# Altium footprint library CeleronLib_THD.PcbLib: 217 footprints (part 2 of 14)
Each footprint in its own frame and in the unit in brackets; x right, y up, seen from the top. Pads: shape width x height; smd on the part's side, far side on the other; paste and mask are expansions set on the pad; w line width, h text height; cw(c..) or ccw(c..) is an arc to the next point about the centre after c.
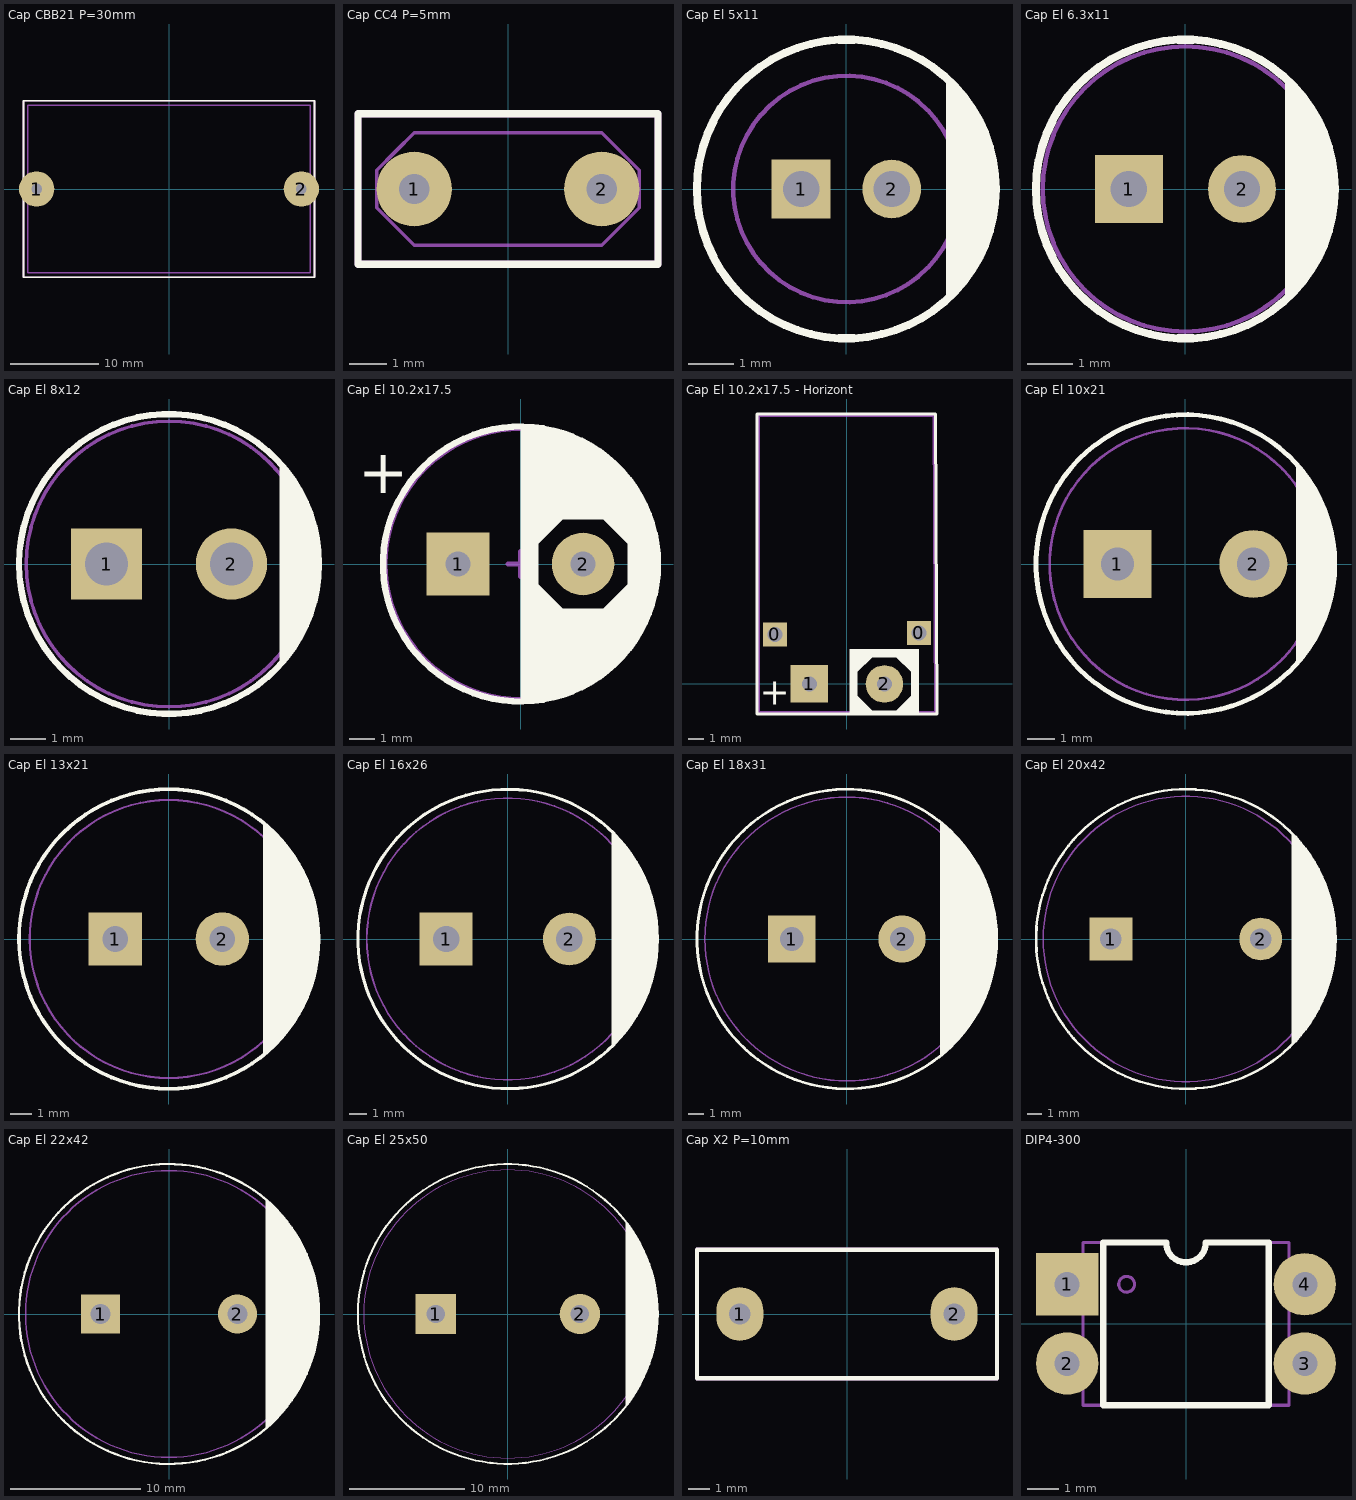
[diagram p1: the footprints below, top view; thin cyan lines are the x and y axes]

## Cap CBB21 P=30mm [mm] "Конденсатор плёночный, типа CBB21..."
height 30
pads (2):
  round 4 hole 1.2 unplated: 1(-15,0) 2(15,0)
Top Overlay:
  lines w0.2: -16.5,-10 16.5,-10 16.5,10 -16.5,10 -16.5,-10
Top 3D:
  circle w0.1: c-15,0 r0.3
  circle w0.1: c15,0 r0.3
  lines w0.2: -16,-9.5 16,-9.5 16,9.5 -16,9.5 -16,-9.5
Top Courtyard:
  lines w0.2: -16.5,-10 -16.5,10 16.5,10 16.5,-10 -16.5,-10
3D body: height 1, standoff -3, extent -15.305,-0.305 -14.695,0.305
3D body: height 1, standoff -3, extent 14.689,-0.305 15.3,0.305
3D body: height 30, standoff 1, extent -15.999,-9.499 15.999,9.499

## Cap CC4 P=5mm [mm] "Конденсатор керамический многослойный низковольтный (50V) выводной, типа CC4/CT4..."
height 5
pads (2):
  round 2 hole 0.8 unplated: 1(-2.5,0) 2(2.5,0)
Top Overlay:
  lines w0.2: -4,-2 -4,2 4,2 4,-2 -4,-2
Top 3D:
  circle w0.1: c2.5,0 r0.3
  circle w0.1: c-2.5,0 r0.3
  lines w0.1: -3.5,-0.5 -3.5,0.5 -3,1 -2.5,1.5 2.5,1.5 3.5,0.5 3.5,-0.5 2.5,-1.5 -2.5,-1.5 -3.5,-0.5
Top Courtyard:
  lines w0.2: -4,-2 4,-2 4,2 -4,2 -4,-2
3D body: height 5, standoff 1, extent -3.501,-1.501 3.501,1.501
3D body: height 1, standoff -3, extent 2.195,-0.305 2.805,0.305
3D body: height 1, standoff -3, extent -2.805,-0.305 -2.195,0.305

## Cap El 5x11 [mm] "Между выводами 2 мм, d =0.5"
height 11
pads (2):
  rect 1.3x1.3 hole 0.8: 1(-1,0)
  round 1.3 hole 0.8: 2(1,0)
Top Overlay:
  circle w0.178: c0,0 r3.3
  region: 2.225,2.45 2.35,2.375 2.475,2.25 2.55,2.2 2.65,2.1 2.7,1.975 2.85,1.8 2.95,1.5 3.05,1.3 3.15,0.9 3.25,0.6 3.275,0.35 3.325,-0.05 3.25,-0.7 3.2,-0.875 3.075,-1.25 2.95,-1.5 2.9,-1.675 2.75,-1.9 2.625,-2.05 2.45,-2.3 2.275,-2.4
  lines w0.2: 2.3,-2.325 2.3,2.35
Bottom Overlay:
  text "+" at -1.375,-2.375 h1.2
Top 3D:
  circle w0.1: c0,0 r2.5
  circle w0.1: c1,0 r0.3
  circle w0.1: c-1,0 r0.3
3D body: height 11, standoff 0.1, extent -2.512,-2.512 2.512,2.512
3D body: height 0.1, standoff -3, extent -1.305,-0.305 -0.695,0.305
3D body: height 0.1, standoff -3, extent 0.695,-0.305 1.305,0.305

## Cap El 6.3x11 [mm] "Между выводами 2.5 мм, d =0.5"
height 11
pads (2):
  rect 1.5x1.5 hole 0.8: 1(-1.25,0)
  round 1.5 hole 0.8: 2(1.25,0)
Top Overlay:
  circle w0.178: c0,0 r3.3
  region: 2.225,2.45 2.35,2.375 2.475,2.25 2.55,2.2 2.65,2.1 2.7,1.975 2.85,1.8 2.95,1.5 3.05,1.3 3.15,0.9 3.25,0.6 3.275,0.35 3.325,-0.05 3.25,-0.7 3.2,-0.875 3.075,-1.25 2.95,-1.5 2.9,-1.675 2.75,-1.9 2.625,-2.05 2.45,-2.3 2.275,-2.4
  lines w0.2: 2.3,-2.325 2.3,2.35
Bottom Overlay:
  text "+" at -1.6,-2.3 h1.2
Top 3D:
  circle w0.1: c-1.25,0 r0.3
  circle w0.1: c1.25,0 r0.3
  circle w0.1: c0,0 r3.15
3D body: height 11, standoff 0.1, extent -3.159,-3.159 3.159,3.159
3D body: height 0.1, standoff -3, extent 0.945,-0.305 1.555,0.305
3D body: height 0.1, standoff -3, extent -1.555,-0.305 -0.945,0.305

## Cap El 8x12 [mm] "Между выводами 3.5 мм, d =0.6"
height 12
pads (2):
  rect 2x2 hole 1.2: 1(-1.75,0)
  round 2 hole 1.2: 2(1.75,0)
Top Overlay:
  circle w0.178: c0,0 r4.2
  region: 3.2,2.7 3.5,2.4 3.5,2.3 3.6,2.2 3.6,2.1 3.8,1.9 3.9,1.6 4,1.4 4.1,1 4.2,0.7 4.2,-0.6 4.1,-0.7 4.1,-1.2 3.9,-1.4 3.9,-1.6 3.7,-1.8 3.7,-2.1 3.5,-2.3 3.5,-2.4 3.2,-2.7
  lines w0.2: 3.2,-2.7 3.2,2.7
Bottom Overlay:
  text "+" at -2.2,-3 h1.2
Top 3D:
  circle w0.1: c-1.75,0 r0.3
  circle w0.1: c1.75,0 r0.3
  circle w0.1: c0,0 r4
3D body: height 12, standoff 0.1, extent -4.012,-4.012 4.012,4.012
3D body: height 0.1, standoff -3, extent 1.445,-0.305 2.055,0.305
3D body: height 0.1, standoff -3, extent -2.055,-0.305 -1.445,0.305

## Cap El 10.2x17.5 [mm] "D=10.2 d=0.6 S=5.0 h=17.5"
height 17.5
pads (2):
  rect 2.5x2.5 hole 1: 1(-2.5,0)
  round 2.5 hole 1: 2(2.5,0)
Top Overlay:
  circle w0.254: c0,0 r5.5
  region: 0,5.5 0,-5.5 0.8,-5.5 1,-5.3 1.8,-5.3 1.9,-5.2 2.1,-5.2 2.4,-4.9 2.7,-4.9 3.1,-4.5 3.3,-4.5 4.5,-3.3 4.5,-3.1 4.8,-2.8 4.8,-2.5 5.1,-2.2 5.1,-1.9 5.3,-1.7 5.3,-1.1 5.5,-0.9 5.5,0 4.3,0 4.3,-0.8 3.3,-1.8 1.7,-1.8 0.7,-0.8 0.7,0.8 1.7,1.8 3.3,1.8 4.3,0.8 4.3,0 5.5,0 5.5,1 5.3,1.2 5.3,1.6 5.1,1.8 5.1,2.2 4.9,2.4 4.9,2.7 4.3,3.3 4.3,3.5 3.4,4.4 3.2,4.4 2.8,4.8 2.6,4.8 2.3,5.1 1.9,5.1 1.7,5.3 1,5.3 0.8,5.5
  text "+" at -6.5,2.25 h3
Top Courtyard:
  circle w0.178: c0,0 r5.4
  lines w0.2: -0.5,0 0.5,0 ; 0,-0.5 0,0.5
3D body: height 20.01, standoff -2.7, extent -5,-5 4.967,5

## Cap El 10.2x17.5 - Horizont [mm] "D=10.2 d=0.6 S=5.0 h=11"
height 11
pads (4):
  rect 1.6x1.6 hole 1 unplated: 0(-4.8,3.3) 0(4.8,3.4)
  rect 2.5x2.5 hole 1: 1(-2.5,0)
  round 2.5 hole 1: 2(2.5,0)
Top Overlay:
  region: 0.2,2.3 0.2,-1.9 4.8,-1.9 4.8,0 4.3,0 4.3,-0.8 3.3,-1.8 1.7,-1.8 0.7,-0.8 0.7,0.8 1.7,1.8 3.3,1.8 4.3,0.8 4.3,0 4.8,0 4.8,2.3
  lines w0.2: -6,-2 6.005,-2 5.9,18 -6,18 -6,-2
  text "+" at -5.8,-2 h3
Top Courtyard:
  lines w0.2: -5.9,-1.9 5.9,-1.9 5.8,17.9 -5.9,17.9 -5.9,-1.9
3D body: height 10.13, standoff -3.58, extent -5.051,-0.294 5,17.694

## Cap El 10x21 [mm] "Между выводами 5 мм, d =0.6"
height 21
pads (2):
  rect 2.5x2.5 hole 1.2: 1(-2.5,0)
  round 2.5 hole 1.2: 2(2.5,0)
Top Overlay:
  circle w0.178: c0,0 r5.5
  region: 4.125,2.825 4.15,2.975 4.15,3.075 4.1,3.525 4.1,3.65 4.25,3.475 4.575,3.075 4.85,2.525 5.15,1.825 5.4,0.9 5.545,-0.055 5.45,-0.875 5.3,-1.4 5.125,-1.975 4.9,-2.4 4.7,-2.85 4.425,-3.275 4.225,-3.5 4.1,-3.6 4.175,-3.375 4.1,-2.9 4.125,-2.65 4.125,0.05 4.15,1.4 4.125,2.075
  lines w0.2: 4.175,-3.55 4.175,3.525
Bottom Overlay:
  text "+" at -3,-3.5 h1.2
Top 3D:
  circle w0.1: c0,0 r5
  circle w0.1: c2.5,0 r0.3
  circle w0.1: c-2.5,0 r0.3
3D body: height 21, standoff 0.1, extent -5.01,-5.01 5.01,5.01
3D body: height 0.1, standoff -3, extent -2.805,-0.305 -2.195,0.305
3D body: height 0.1, standoff -3, extent 2.195,-0.305 2.805,0.305

## Cap El 13x21 [mm] "Между выводами 5 мм, d =0.6"
height 21
pads (2):
  rect 2.5x2.5 hole 1.2: 1(-2.5,0)
  round 2.5 hole 1.2: 2(2.5,0)
Top Overlay:
  circle w0.178: c0,0 r7
  region: 4.55,5.135 4.686,5.217 5.979,3.707 6.45,2.625 6.675,1.9 6.875,0.95 7.02,-0.005 6.925,-0.825 6.85,-1.35 6.8,-1.675 6.55,-2.425 6.25,-3.1 5.575,-4.2 4.672,-5.193 4.55,-5.162
  lines w0.2: 4.5,-5.35 4.5,5.35
Bottom Overlay:
  text "+" at -3,-3.5 h1.2
Top 3D:
  circle w0.1: c-2.5,0 r0.3
  circle w0.1: c2.5,0 r0.3
  circle w0.1: c0,0 r6.5
3D body: height 21, standoff 0.1, extent -6.51,-6.51 6.51,6.51
3D body: height 0.1, standoff -4, extent 2.195,-0.305 2.805,0.305
3D body: height 0.1, standoff -4, extent -2.805,-0.305 -2.195,0.305

## Cap El 16x26 [mm] "Между выводами 7.5 мм, d =0.8"
height 26
pads (2):
  rect 3x3 hole 1.5: 1(-3.5,0)
  round 3 hole 1.5: 2(3.5,0)
Top Overlay:
  circle w0.178: c0,0 r8.5
  region: 6,6 6.223,5.817 6.375,5.664 6.502,5.512 6.731,5.232 6.858,5.08 7.112,4.699 7.425,4.2 7.747,3.607 7.925,3.15 8.052,2.819 8.179,2.438 8.306,2.007 8.407,1.575 8.484,1.041 8.525,0.525 8.534,0.203 8.534,-0.33 8.484,-0.914 8.382,-1.651 8.255,-2.159 8.128,-2.565 8.001,-2.921 7.747,-3.556 7.538,-3.961 7.239,-4.445 6.985,-4.902 6.731,-5.207 6.5,-5.475 6.274,-5.74 6,-6
  lines w0.2: 6,-6 6,6
Bottom Overlay:
  text "+" at -4.5,-5.475 h3
Top 3D:
  circle w0.1: c0,0 r8
  circle w0.1: c3.5,0 r0.4
  circle w0.1: c-3.5,0 r0.4
3D body: height 26, standoff 0.1, extent -8.012,-8.012 8.012,8.012
3D body: height 0.1, standoff -4, extent -3.907,-0.407 -3.093,0.407
3D body: height 0.1, standoff -4, extent 3.093,-0.407 3.907,0.407

## Cap El 18x31 [mm] "Между выводами 7.5 мм, d =0.8"
height 31
pads (2):
  rect 3x3 hole 1.5: 1(-3.5,0)
  round 3 hole 1.5: 2(3.5,0)
Top Overlay:
  circle w0.178: c0,0 r9.5
  region: 6.025,6.082 6.075,7.275 7.4,5.925 8.05,5 8.525,4.1 8.775,3.575 8.975,3.025 9.226,2.276 9.426,1.326 9.524,0.374 9.476,-0.449 9.401,-0.974 9.246,-1.985 8.95,-3.075 8.537,-4.112 7.975,-5.125 7.55,-5.775 6.825,-6.575 6.05,-7.275
  lines w0.2: 6,-7.35 6,7.325
Bottom Overlay:
  text "+" at -4.5,-5.475 h3
Top 3D:
  circle w0.1: c-3.5,0 r0.4
  circle w0.1: c3.5,0 r0.4
  circle w0.1: c0,0 r9
3D body: height 31, standoff 0.1, extent -9.01,-9.01 9.01,9.01
3D body: height 0.1, standoff -4.5, extent 3.093,-0.407 3.907,0.407
3D body: height 0.1, standoff -4.5, extent -3.907,-0.407 -3.093,0.407

## Cap El 20x42 [mm] "Между выводами 10.5 мм, d =0.8"
height 42
pads (2):
  rect 3x3 hole 1.5: 1(-5.25,0)
  round 3 hole 1.5: 2(5.25,0)
Top Overlay:
  circle w0.178: c0,0 r10.5
  region: 7.45,7.35 8.125,6.6 8.691,5.759 9.2,5.025 9.6,4.225 9.776,3.651 9.976,3.101 10.228,2.353 10.428,1.403 10.525,0.45 10.478,-0.372 10.403,-0.897 10.275,-1.925 10.175,-2.55 9.9,-3.425 9.5,-4.5 8.648,-6.062 8.275,-6.45 7.644,-7.193 7.489,-7.13
  lines w0.2: 7.5,-7.325 7.5,7.325
Bottom Overlay:
  text "+" at -6.225,-5.55 h3
Top 3D:
  circle w0.1: c-5.25,0 r0.4
  circle w0.1: c5.25,0 r0.4
  circle w0.1: c0,0 r10
3D body: height 0.1, standoff -4.5, extent 4.843,-0.407 5.657,0.407
3D body: height 0.1, standoff -4.5, extent -5.657,-0.407 -4.843,0.407
3D body: height 42, standoff 0.1, extent -10.011,-10.011 10.012,10.012

## Cap El 22x42 [mm] "Между выводами 10.5 мм, d =0.8"
height 42
pads (2):
  rect 3x3 hole 1.5: 1(-5.25,0)
  round 3 hole 1.5: 2(5.25,0)
Top Overlay:
  circle w0.178: c0,0 r11.5
  region: 7.48,8.41 7.55,8.55 8.025,8.3 8.675,7.5 9.025,7.1 9.35,6.7 9.875,5.875 10.3,5.125 10.625,4.275 10.775,4 10.85,3.7 10.975,3.425 11.075,3.15 11.201,2.364 11.401,1.414 11.499,0.461 11.451,-0.361 11.376,-0.886 11.375,-1.375 11.249,-1.914 11.149,-2.539 10.95,-3.45 10.525,-4.575 10.125,-5.4 9.9,-5.85 9.625,-6.25 9.3,-6.725 7.725,-8.525 7.526,-8.522
  lines w0.2: 7.5,-8.675 7.5,8.7
Bottom Overlay:
  text "+" at -6.225,-5.55 h3
Top 3D:
  circle w0.1: c-5.25,0 r0.4
  circle w0.1: c5.25,0 r0.4
  circle w0.1: c0,0 r11
3D body: height 0.1, standoff -4.5, extent 4.843,-0.407 5.657,0.407
3D body: height 0.1, standoff -4.5, extent -5.657,-0.407 -4.843,0.407
3D body: height 42, standoff 0.1, extent -11.01,-11.01 11.01,11.01

## Cap El 25x50 [mm] "Между выводами 12.5 мм, d =1.0"
height 50
pads (2):
  rect 3.5x3.5 hole 1.6: 1(-6.25,0)
  round 3.5 hole 1.6: 2(6.25,0)
Top Overlay:
  circle w0.178: c0,0 r13
  region: 10.3,7.9 10.6,7.5 10.9,7.1 11.2,6.6 11.6,5.9 11.8,5.4 12.1,4.7 12.3,4.2 12.4,3.9 12.5,3.5 12.6,3.1 12.8,2.3 12.926,1.364 13.024,0.411 13,-0.3 13,-0.962 12.9,-1.6 12.85,-2.037 12.7,-2.688 12.6,-3.1 12.5,-3.5 12.3,-4.1 12.1,-4.7 11.8,-5.4 11.5,-6 11.3,-6.4 11,-6.9 10.3,-7.9
  lines w0.2: 10.3,-7.9 10.3,7.9
Bottom Overlay:
  text "+" at -7.25,-5.75 h3
Top 3D:
  circle w0.1: c0,0 r12.5
  circle w0.1: c6.25,0 r0.5
  circle w0.1: c-6.25,0 r0.5
3D body: height 50, standoff 0.1, extent -12.511,-12.511 12.511,12.511
3D body: height 0.1, standoff -5, extent -6.759,-0.509 -5.741,0.509
3D body: height 0.1, standoff -5, extent 5.741,-0.509 6.759,0.509

## Cap X2 P=10mm [mm] "FCAP 0.01u/275VAC PP X2 L = 13 mm, S = 5 mm, H = 11 mm P = 10 mm, d = 0.6 mm"
height 12
pads (2):
  oval 2.2x2.5 hole 1 unplated: 1(-5,0) 2(5,0)
Top Overlay:
  lines w0.2: -7,-3 -7,3 7,3 7,-3 -7,-3
Top Courtyard:
  lines w0.2: -7,-3 7,-3 7,3 -7,3 -7,-3
3D body: height 12, standoff -2.81, extent -6.5,-2.5 6.5,2.501

## DIP4-300 [mm] "DIP 4 Leads, Row Spacing 7.62 mm; Pitch 2.54 mm"
height 5.08
pads (4):
  rect 2x2 hole 0.8: 1(-3.81,1.27)
  round 2 hole 0.8: 2(-3.81,-1.27) 3(3.81,-1.27) 4(3.81,1.27)
Top Overlay:
  lines w0.2: -0.635,2.61 ccw(c0,2.61) 0.635,2.61 ; -0.635,2.61 ccw(c0,2.61) 0.635,2.61 ; -0.635,2.61 -2.65,2.61 -2.65,-2.61 2.65,-2.61 2.65,2.61 0.635,2.61
Top Assy:
  circle w0.1: c-1.905,1.27 r0.254
  lines w0.1: -3.3,-2.61 -3.3,2.61 -0.635,2.61 ccw(c0,2.61) 0.635,2.61 3.3,2.61 3.3,-2.61 -3.3,-2.61
3D body: height 5.33, standoff -3.3, extent -3.935,-2.54 3.935,2.54